# Altium footprint library rcl.PCBLIB: 513 footprints (part 8 of 33)
Each footprint in its own frame and in the unit in brackets; x right, y up, seen from the top. Pads: shape width x height; smd on the part's side, far side on the other; paste and mask are expansions set on the pad; w line width, h text height; cw(c..) or ccw(c..) is an arc to the next point about the centre after c.
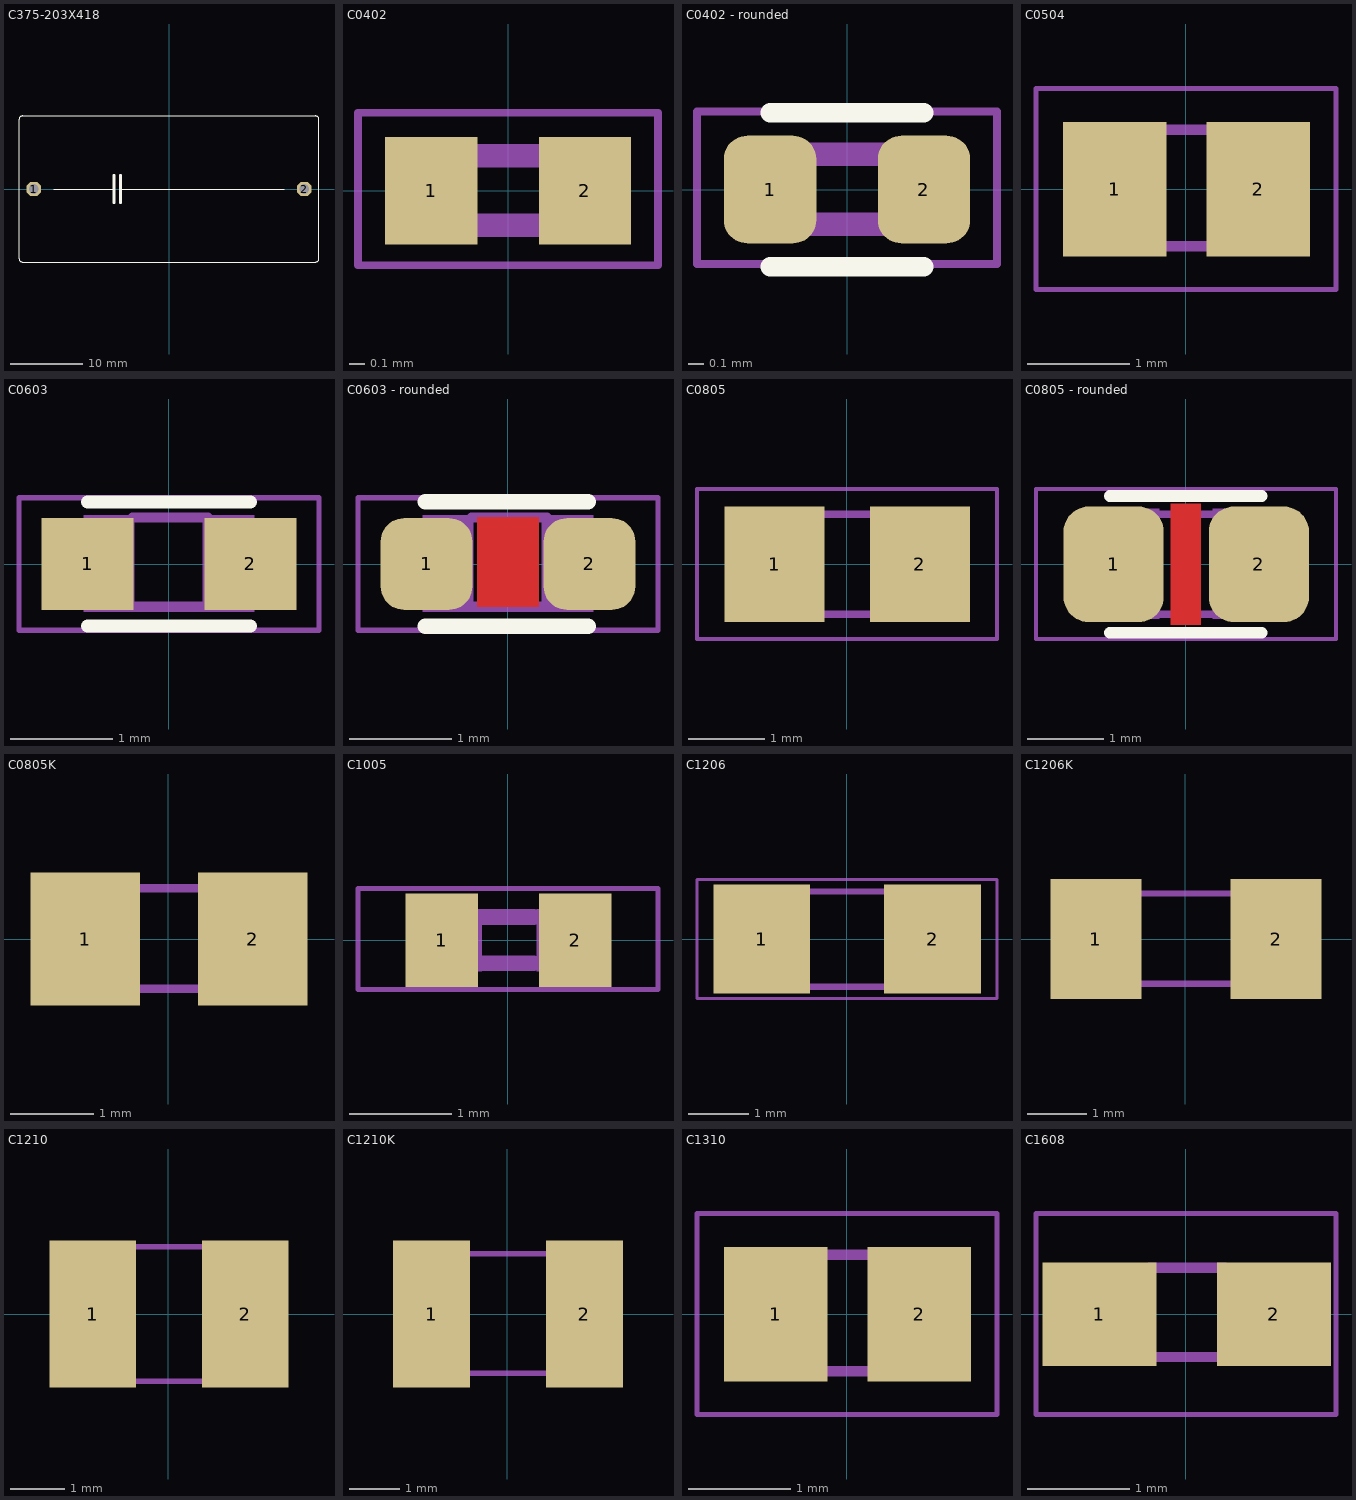
[diagram p7: the footprints below, top view; thin cyan lines are the x and y axes]

## C375-203X418 [mil]
pads (2):
  oct 78x78 hole 52: 1(-740,0) 2(740,0)
Top Overlay:
  lines w6: -630,0 -300,0 ; -265,0 630,0 ; -820,-380 ccw(c-800,-380) -800,-400 800,-400 ccw(c800,-380) 820,-380 820,380 ccw(c800,380) 800,400 -800,400 ccw(c-800,380) -820,380 -820,-380
  lines w16: -300,-75 -300,0 -300,75 ; -265,-75 -265,0 -265,75

## C0402 [mm]
pads (2):
  rect 0.6x0.7 smd: 1(-0.5,0) 2(0.5,0)
Mechanical 4:
  rectangle: 0.279,-0.305 0.559,0.305
  rectangle: -0.554,-0.305 -0.254,0.305
  lines w0.051: -0.975,-0.483 -0.975,0.508 0.975,0.508 0.975,-0.483 -0.975,-0.483
  lines w0.152: -0.245,-0.224 0.254,-0.224 ; -0.245,0.229 0.254,0.229
3D body "User Library-0402C.step": height 0.36, standoff 0, extent -0.5,-0.265 0.5,0.265

## C0402 - rounded [mm]
pads (2):
  rrect50% 0.6x0.7 smd: 1(-0.5,0) 2(0.5,0)
Top Overlay:
  lines w0.127: -0.5,-0.5 0.5,-0.5 ; -0.5,0.5 0.5,0.5
Mechanical 4:
  rectangle: -0.554,-0.305 -0.254,0.305
  rectangle: 0.279,-0.305 0.559,0.305
  lines w0.051: -0.975,-0.483 0.975,-0.483 0.975,0.508 -0.975,0.508 -0.975,-0.483
  lines w0.152: -0.245,-0.224 0.254,-0.224 ; -0.245,0.229 0.254,0.229
3D body "User Library-0402C.step": height 0.36, standoff 0, extent -0.5,-0.265 0.5,0.265

## C0504 [mil]
pads (2):
  rect 40x52 smd: 1(-27.56,0) 2(28,0)
Mechanical 4:
  rectangle: 11,-24.5 26,25
  rectangle: -26,-24.5 -11.04,25
  lines w2: -57.99,-38.7 -57.99,39 58,39 58,-38.7 -57.99,-38.7
  lines w4: -11.57,-22.01 12,-22.01 ; -11.57,23 12,23

## C0603 [mm]
pads (2):
  rect 0.9x0.9 smd: 1(-0.8,0) 2(0.8,0)
Top Overlay:
  lines w0.127: -0.8,-0.61 0.8,-0.61 ; -0.8,0.61 0.8,0.61
Mechanical 4:
  rectangle: 0.33,-0.47 0.838,0.483
  rectangle: -0.838,-0.47 -0.338,0.483
  lines w0.051: -1.473,-0.65 -1.473,0.65 1.473,0.65 1.473,-0.65 -1.473,-0.65
  lines w0.102: -0.356,-0.419 0.381,-0.419 ; -0.356,0.457 0.381,0.457
3D body "User Library-cap_0603-1.step": height 0.8, standoff 0, extent -0.8,-0.4 0.8,0.4

## C0603 - rounded [mm]
pads (2):
  rrect50% 0.9x0.9 smd: 1(-0.8,0) 2(0.8,0)
Top Layer:
  pour cut-out: -0.3,0.457 -0.3,-0.419 0.3,-0.419 0.3,0.457
Top Overlay:
  lines w0.152: -0.813,-0.61 0.787,-0.61 ; -0.813,0.61 0.787,0.61
Mechanical 4:
  rectangle: -0.838,-0.47 -0.338,0.483
  rectangle: 0.33,-0.47 0.838,0.483
  lines w0.051: -1.473,-0.65 1.473,-0.65 1.473,0.65 -1.473,0.65 -1.473,-0.65
  lines w0.102: -0.356,-0.419 0.381,-0.419 ; -0.356,0.457 0.381,0.457
3D body "User Library-cap_0603-1.step": height 0.8, standoff 0, extent -0.8,-0.4 0.8,0.4

## C0805 [mil]
pads (2):
  rect 52x60 smd: 1(-37.4,0) 2(38,0)
Mechanical 4:
  rectangle: 14,-28.5 44,29
  rectangle: -43,-28.5 -13.47,29
  lines w2: -77.68,-38.7 -77.68,39 78,39 78,-38.7 -77.68,-38.7
  lines w4: -15,26 15,26 ; -14.02,-25.98 15,-25.98
3D body "User Library-cap_0805-1.step": height 47.24, standoff 0, extent -39.37,-23.62 39.37,23.63

## C0805 - rounded [mil]
pads (2):
  rrect50% 52x60 smd: 1(-37.4,0) 2(38,0)
Top Layer:
  pour cut-out: -7.87,31.5 -7.87,-31.5 7.87,-31.5 7.87,31.5
Top Overlay:
  lines w6: -39.37,-35.43 39.37,-35.43 ; -39.37,35.43 39.37,35.43
Mechanical 4:
  rectangle: -43,-28.5 -13.47,29
  rectangle: 14,-28.5 44,29
  lines w2: -77.68,-38.7 78,-38.7 78,39 -77.68,39 -77.68,-38.7
  lines w4: -15,26 15,26 ; -14.02,-25.98 15,-25.98
3D body "User Library-cap_0805-1.step": height 47.24, standoff 0, extent -39.37,-23.62 39.37,23.63

## C0805K [mil]
pads (2):
  rect 52x63 smd: 1(-39.37,0) 2(40,0)
Mechanical 4:
  rectangle: 20,-25.59 40,26
  rectangle: -39.37,-25.59 -19.68,26
  lines w4: -36.42,-23.62 37,-23.62 ; -36.42,24 37,24
3D body "User Library-cap_0805-1.step": height 47.24, standoff 0, extent -39.37,-23.62 39.37,23.62

## C1005 [mil]
pads (2):
  rect 28x36 smd: 1(-25.59,0) 2(26,0)
Mechanical 4:
  rectangle: 11,-12 22,12
  rectangle: -21.81,-12 -10,12
  lines w2: -57.99,-19.02 -57.99,20 58,20 58,-19.02 -57.99,-19.02
  lines w6: -9.65,-8.82 10,-8.82 ; -9.65,9 10,9

## C1206 [mil]
pads (2):
  rect 63x71 smd: 1(-55.12,0) 2(56,0)
Mechanical 4:
  rectangle: -67,-33.5 -37.47,34
  rectangle: 38,-33.43 67,34
  lines w2: -97.36,-38.7 98,-38.7 98,39 -97.36,39 -97.36,-38.7
  lines w4: -37.99,-30.98 38,-30.98 ; -37.99,31 38,31
3D body "User Library-CAPC3216X10.step": height 39.37, standoff 0, extent -62.99,-31.49 63,31.5

## C1206K [mil]
pads (2):
  rect 60x79 smd: 1(-59.06,0) 2(60,0)
Mechanical 4:
  rectangle: 44,-31.5 63,32
  rectangle: -62.99,-31.5 -43.31,32
  lines w4: -60.04,-29.53 61,-29.53 ; -60.04,30 61,30
3D body "User Library-CAPC3216X10.step": height 39.37, standoff 0, extent -62.99,-31.49 62.99,31.5

## C1210 [mil]
pads (2):
  rect 63x107 smd: 1(-55.12,0) 2(56,0)
Mechanical 4:
  rectangle: 38,-51.36 67,51
  rectangle: -67,-51 -37.47,52
  lines w4: -38,-49 38,-49 ; -38,49 38,49
3D body "User Library-CAPC3225X13.step": height 51.18, standoff 0, extent -62.99,-49.21 63,49.21

## C1210K [mil]
pads (2):
  rect 60x115 smd: 1(-59.06,0) 2(60,0)
Mechanical 4:
  rectangle: -62.99,-49.21 -43.31,50
  rectangle: 44,-49.21 63,50
  lines w4: -60.04,-46.26 61,-46.26 ; -60.04,47 61,47
3D body "User Library-CAPC3225X13.step": height 51.18, standoff 0, extent -62.99,-49.21 63,49.22

## C1310 [mil]
pads (2):
  rect 40x52 smd: 1(-27.56,0) 2(28,0)
Mechanical 4:
  rectangle: -26,-24.5 -11.04,25
  rectangle: 11,-24.5 26,25
  lines w2: -57.99,-38.7 58,-38.7 58,39 -57.99,39 -57.99,-38.7
  lines w4: -11.57,-22.01 12,-22.01 ; -11.57,23 12,23

## C1608 [mil]
pads (2):
  rect 44x40 smd: 1(-33.46,0) 2(34,0)
Mechanical 4:
  rectangle: 13,-18.5 33,19
  rectangle: -33,-18.5 -13.31,19
  lines w2: -57.99,-38.7 -57.99,39 58,39 58,-38.7 -57.99,-38.7
  lines w4: -14.02,-16.5 15,-16.5 ; -14.02,18 15,18